# Altium footprint library BBC_Footprints.PcbLib: 171 footprints (part 9 of 11)
Each footprint in its own frame and in the unit in brackets; x right, y up, seen from the top. Pads: shape width x height; smd on the part's side, far side on the other; paste and mask are expansions set on the pad; w line width, h text height; cw(c..) or ccw(c..) is an arc to the next point about the centre after c.
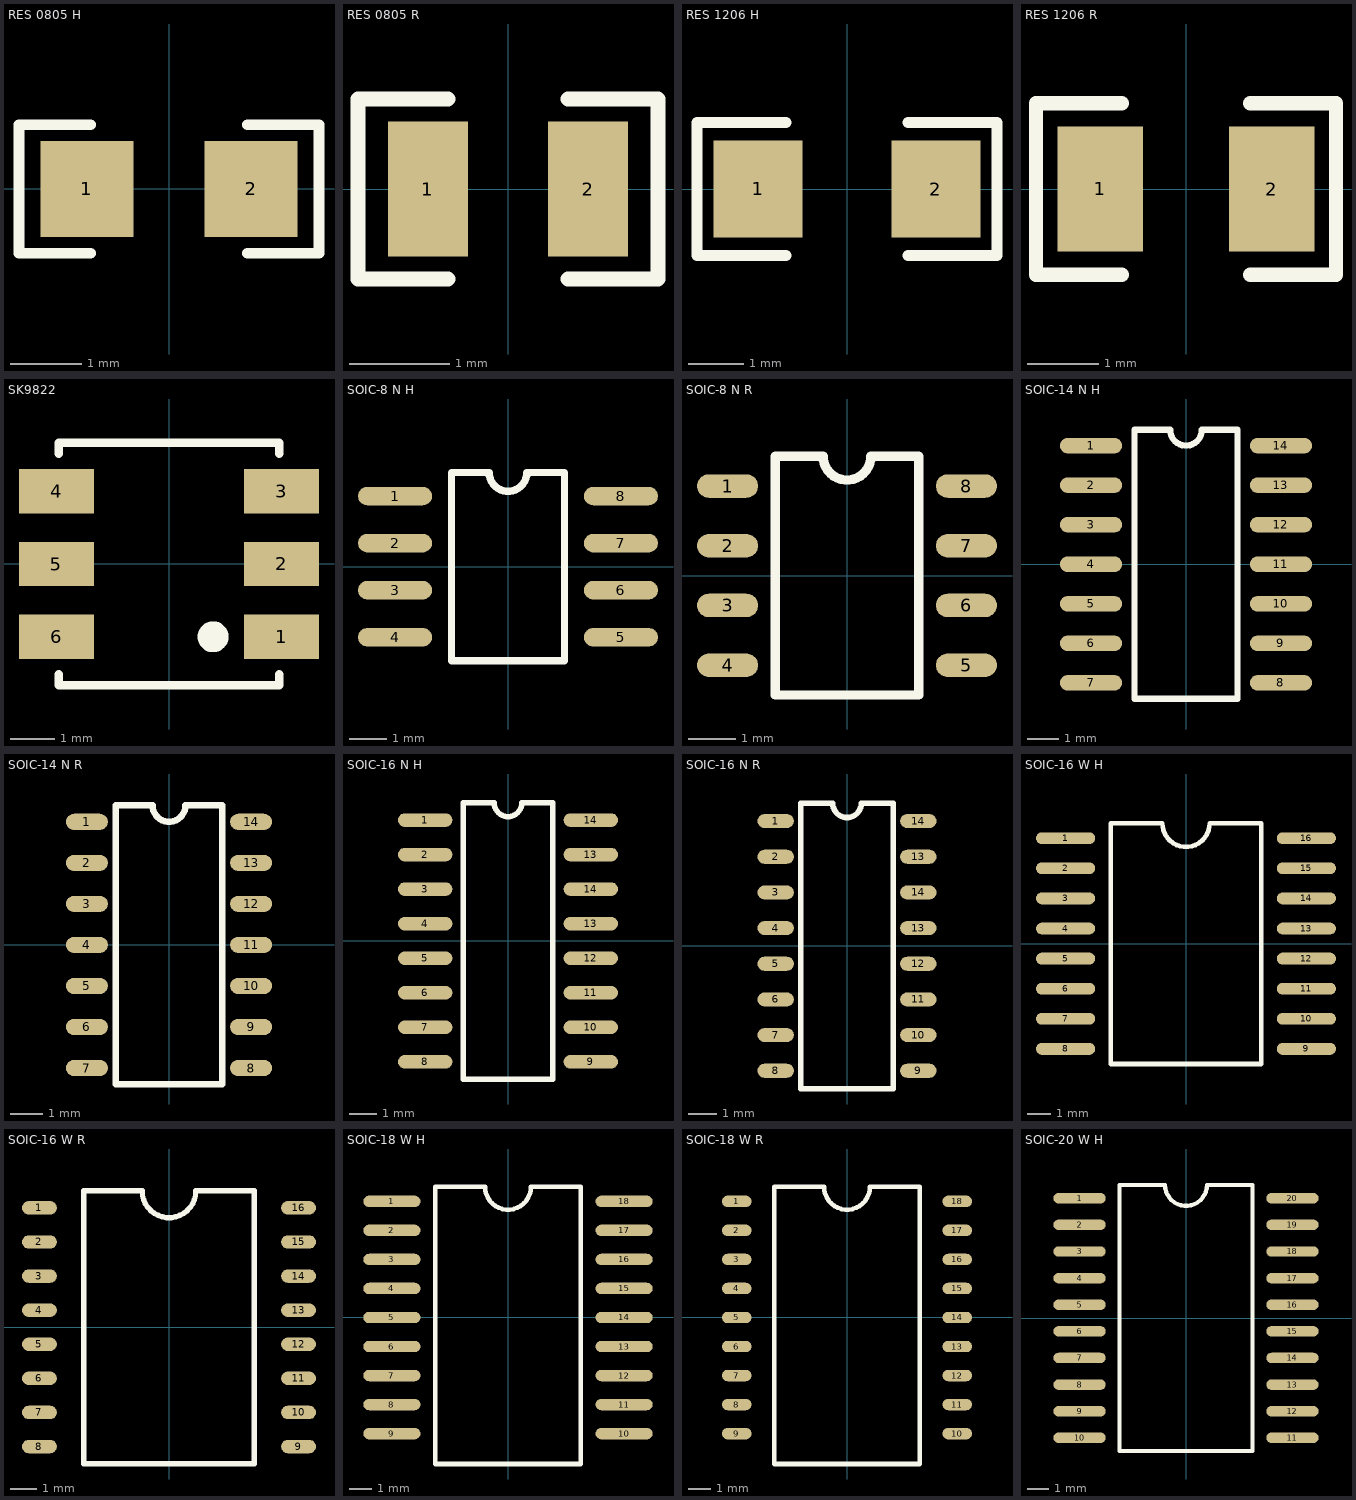
[diagram p8: the footprints below, top view; thin cyan lines are the x and y axes]

## RES 0805 H [mm] "0805 resistor for hand soldering"
pads (2):
  rect 1.3x1.35 smd: 1(-1.15,0) 2(1.15,0)
Top Overlay:
  lines w0.15: -1.1,-0.9 -2.1,-0.9 -2.1,0.9 -1.1,0.9 ; 1.1,-0.9 2.1,-0.9 2.1,0.9 1.1,0.9
3D body "RES 0805.step": height 0.76, standoff 0, extent -1.15,-0.675 1.15,0.675

## RES 0805 R [mm] "0805 resistor for reflow soldering"
pads (2):
  rect 0.8x1.35 smd: 1(-0.8,0) 2(0.8,0)
Top Overlay:
  lines w0.15: -0.6,-0.9 -1.5,-0.9 -1.5,0.9 -0.6,0.9 ; 0.6,-0.9 1.5,-0.9 1.5,0.9 0.6,0.9
3D body "RES 0805.step": height 0.76, standoff 0, extent -1.15,-0.675 1.15,0.675

## RES 1206 H [mm] "1206 resistor for hand soldering"
pads (2):
  rect 1.6x1.75 smd: 1(-1.6,0) 2(1.6,0)
Top Overlay:
  lines w0.2: -1.1,-1.2 -2.7,-1.2 -2.7,1.2 -1.1,1.2 ; 1.1,-1.2 2.7,-1.2 2.7,1.2 1.1,1.2
3D body "1206 RES.step": height 0.85, standoff 0, extent -1.675,-0.865 1.675,0.865

## RES 1206 R [mm] "1206 resistor for reflow soldering"
pads (2):
  rect 1.2x1.75 smd: 1(-1.2,0) 2(1.2,0)
Top Overlay:
  lines w0.2: -0.9,-1.2 -2.1,-1.2 -2.1,1.2 -0.9,1.2 ; 0.9,-1.2 2.1,-1.2 2.1,1.2 0.9,1.2
3D body "1206 RES.step": height 0.85, standoff 0, extent -1.675,-0.865 1.675,0.865

## SK9822 [mm] "SPI RGB LED"
pads (6):
  rect 1.7x1 smd: 1(2.55,-1.65) 2(2.55,0) 3(2.55,1.65) 4(-2.55,1.65) 5(-2.55,0) 6(-2.55,-1.65)
Top Overlay:
  circle w0.5: c1,-1.65 r0.1
  lines w0.2: -2.5,-2.5 -2.5,-2.75 2.5,-2.75 2.5,-2.5 ; -2.5,2.5 -2.5,2.75 2.5,2.75 2.5,2.5
3D body "User Library-APA102C.step": height 1.53, standoff -0.02, extent -2.75,-2.5 2.75,2.5

## SOIC-8 N H [mm] "Narrow (150mil) SOIC with 8 pins for hand soldering"
height 3
pads (8):
  oval 2x0.5 smd: 1(-3.048,1.905) 2(-3.048,0.635) 3(-3.048,-0.635) 4(-3.048,-1.905) 5(3.048,-1.905) 6(3.048,-0.635) 7(3.048,0.635) 8(3.048,1.905)
Top Overlay:
  lines w0.2: -1.524,-2.54 1.524,-2.54 1.524,2.54 0.508,2.54 cw(c0,2.54) -0.508,2.54 -1.524,2.54 -1.524,-2.54
3D body "SOIC-8 1.step": height 1.75, standoff 0, extent -3.06,-2.475 3.06,2.475

## SOIC-8 N R [mm] "Narrow (150mil) SOIC with 8 pins for reflow soldering"
height 3
pads (8):
  oval 1.3x0.5 smd: 1(-2.54,1.905) 2(-2.54,0.635) 3(-2.54,-0.635) 4(-2.54,-1.905) 5(2.54,-1.905) 6(2.54,-0.635) 7(2.54,0.635) 8(2.54,1.905)
Top Overlay:
  lines w0.2: -1.524,-2.54 -1.524,2.54 -0.508,2.54 ccw(c0,2.54) 0.508,2.54 1.524,2.54 1.524,-2.54 -1.524,-2.54
3D body "SOIC-8 1.step": height 1.75, standoff 0, extent -3.06,-2.475 3.06,2.475

## SOIC-14 N H [mm] "Narrow (150mil) SOIC with 14 pins for hand soldering"
height 3
pads (14):
  oval 2x0.5 smd: 1(-3.048,3.81) 2(-3.048,2.54) 3(-3.048,1.27) 4(-3.048,0) 5(-3.048,-1.27) 6(-3.048,-2.54) 7(-3.048,-3.81) 8(3.048,-3.81) 9(3.048,-2.54) 10(3.048,-1.27) 11(3.048,0) 12(3.048,1.27) 13(3.048,2.54) 14(3.048,3.81)
Top Overlay:
  lines w0.2: -1.651,-4.318 -1.651,4.318 -0.508,4.318 ccw(c0,4.318) 0.508,4.318 1.651,4.318 1.651,-4.318 -1.651,-4.318
3D body "SOIC-14 N.step": height 1.75, standoff 0, extent -3.06,-4.35 3.06,4.35

## SOIC-14 N R [mm] "Narrow (150mil) SOIC with 14 pins for reflow soldering"
height 3
pads (14):
  oval 1.3x0.5 smd: 1(-2.54,3.81) 2(-2.54,2.54) 3(-2.54,1.27) 4(-2.54,0) 5(-2.54,-1.27) 6(-2.54,-2.54) 7(-2.54,-3.81) 8(2.54,-3.81) 9(2.54,-2.54) 10(2.54,-1.27) 11(2.54,0) 12(2.54,1.27) 13(2.54,2.54) 14(2.54,3.81)
Top Overlay:
  lines w0.2: -1.651,-4.318 1.651,-4.318 1.651,4.318 0.508,4.318 cw(c0,4.318) -0.508,4.318 -1.651,4.318 -1.651,-4.318
3D body "SOIC-14 N.step": height 1.75, standoff 0, extent -3.06,-4.35 3.06,4.35

## SOIC-16 N H [mm] "Narrow (150mil) SOIC with 16 pins for hand soldering"
height 3
pads (16):
  oval 2x0.5 smd: 1(-3.048,4.445) 2(-3.048,3.175) 3(-3.048,1.905) 4(-3.048,0.635) 5(-3.048,-0.635) 6(-3.048,-1.905) 7(-3.048,-3.175) 8(-3.048,-4.445) 9(3.048,-4.445) 10(3.048,-3.175) 11(3.048,-1.905) 12(3.048,-0.635) 13(3.048,0.635) 13(3.048,3.175) 14(3.048,1.905) 14(3.048,4.445)
Top Overlay:
  lines w0.2: -1.651,-5.08 1.651,-5.08 1.651,5.08 0.508,5.08 cw(c0,5.08) -0.508,5.08 -1.651,5.08 -1.651,-5.08
3D body "SOIC-16 N.step": height 1.75, standoff 0, extent -3.06,-4.975 3.06,4.975

## SOIC-16 N R [mm] "Narrow (150mil) SOIC with 16 pins for reflow soldering"
height 3
pads (16):
  oval 1.3x0.5 smd: 1(-2.54,4.445) 2(-2.54,3.175) 3(-2.54,1.905) 4(-2.54,0.635) 5(-2.54,-0.635) 6(-2.54,-1.905) 7(-2.54,-3.175) 8(-2.54,-4.445) 9(2.54,-4.445) 10(2.54,-3.175) 11(2.54,-1.905) 12(2.54,-0.635) 13(2.54,0.635) 13(2.54,3.175) 14(2.54,1.905) 14(2.54,4.445)
Top Overlay:
  lines w0.2: -1.651,-5.08 -1.651,5.08 -0.508,5.08 ccw(c0,5.08) 0.508,5.08 1.651,5.08 1.651,-5.08 -1.651,-5.08
3D body "SOIC-16 N.step": height 1.75, standoff 0, extent -3.06,-4.975 3.06,4.975

## SOIC-16 W H [mm] "Wide (300mil) SOIC with 16 pins for hand soldering"
height 3
pads (16):
  oval 2.5x0.5 smd: 1(-5.08,4.445) 2(-5.08,3.175) 3(-5.08,1.905) 4(-5.08,0.635) 5(-5.08,-0.635) 6(-5.08,-1.905) 7(-5.08,-3.175) 8(-5.08,-4.445) 9(5.08,-4.445) 10(5.08,-3.175) 11(5.08,-1.905) 12(5.08,-0.635) 13(5.08,0.635) 14(5.08,1.905) 15(5.08,3.175) 16(5.08,4.445)
Top Overlay:
  lines w0.2: -3.175,-5.08 -3.175,5.08 -1,5.08 ccw(c0,5.08) 1,5.08 3.175,5.08 3.175,-5.08 -3.175,-5.08
3D body "SOIC-16 W.step": height 2.65, standoff 0, extent -5.242,-5.175 5.243,5.175

## SOIC-16 W R [mm] "Wide (300mil) SOIC with 16 pins for reflow soldering"
height 3
pads (16):
  oval 1.3x0.5 smd: 1(-4.826,4.445) 2(-4.826,3.175) 3(-4.826,1.905) 4(-4.826,0.635) 5(-4.826,-0.635) 6(-4.826,-1.905) 7(-4.826,-3.175) 8(-4.826,-4.445) 9(4.826,-4.445) 10(4.826,-3.175) 11(4.826,-1.905) 12(4.826,-0.635) 13(4.826,0.635) 14(4.826,1.905) 15(4.826,3.175) 16(4.826,4.445)
Top Overlay:
  lines w0.2: -3.175,-5.08 3.175,-5.08 3.175,5.08 1,5.08 cw(c0,5.08) -1,5.08 -3.175,5.08 -3.175,-5.08
3D body "SOIC-16 W.step": height 2.65, standoff 0, extent -5.242,-5.175 5.243,5.175

## SOIC-18 W H [mm] "Wide (300mil) SOIC with 18 pins for hand soldering"
height 3
pads (18):
  oval 2.5x0.5 smd: 1(-5.08,5.08) 2(-5.08,3.81) 3(-5.08,2.54) 4(-5.08,1.27) 5(-5.08,0) 6(-5.08,-1.27) 7(-5.08,-2.54) 8(-5.08,-3.81) 9(-5.08,-5.08) 10(5.08,-5.08) 11(5.08,-3.81) 12(5.08,-2.54) 13(5.08,-1.27) 14(5.08,0) 15(5.08,1.27) 16(5.08,2.54) 17(5.08,3.81) 18(5.08,5.08)
Top Overlay:
  lines w0.2: -3.175,-6.41 3.175,-6.41 3.175,5.715 1,5.715 cw(c0,5.715) -1,5.715 -3.175,5.715 -3.175,-6.41
3D body "SOIC-18 W.step": height 2.65, standoff 0, extent -5.242,-5.8 5.243,5.8

## SOIC-18 W R [mm] "Wide (300mil) SOIC with 18 pins for reflow soldering"
height 3
pads (18):
  oval 1.3x0.5 smd: 1(-4.826,5.08) 2(-4.826,3.81) 3(-4.826,2.54) 4(-4.826,1.27) 5(-4.826,0) 6(-4.826,-1.27) 7(-4.826,-2.54) 8(-4.826,-3.81) 9(-4.826,-5.08) 10(4.826,-5.08) 11(4.826,-3.81) 12(4.826,-2.54) 13(4.826,-1.27) 14(4.826,0) 15(4.826,1.27) 16(4.826,2.54) 17(4.826,3.81) 18(4.826,5.08)
Top Overlay:
  lines w0.2: -3.175,-6.41 -3.175,5.715 -1,5.715 ccw(c0,5.715) 1,5.715 3.175,5.715 3.175,-6.41 -3.175,-6.41
3D body "SOIC-18 W.step": height 2.65, standoff 0, extent -5.242,-5.8 5.243,5.8

## SOIC-20 W H [mm] "Wide (300mil) SOIC with 20 pins for hand soldering"
height 3
pads (20):
  oval 2.5x0.5 smd: 1(-5.08,5.715) 2(-5.08,4.445) 3(-5.08,3.175) 4(-5.08,1.905) 5(-5.08,0.635) 6(-5.08,-0.635) 7(-5.08,-1.905) 8(-5.08,-3.175) 9(-5.08,-4.445) 10(-5.08,-5.715) 11(5.08,-5.715) 12(5.08,-4.445) 13(5.08,-3.175) 14(5.08,-1.905) 15(5.08,-0.635) 16(5.08,0.635) 17(5.08,1.905) 18(5.08,3.175) 19(5.08,4.445) 20(5.08,5.715)
Top Overlay:
  lines w0.2: -3.175,-6.35 3.175,-6.35 3.175,6.35 1,6.35 cw(c0,6.35) -1,6.35 -3.175,6.35 -3.175,-6.35
3D body "SOIC-20 W.step": height 2.65, standoff 0, extent -5.242,-6.425 5.243,6.425